# Altium footprint library 7.Connectors&Battary_holders.PcbLib: 133 footprints (part 4 of 9)
Each footprint in its own frame and in the unit in brackets; x right, y up, seen from the top. Pads: shape width x height; smd on the part's side, far side on the other; paste and mask are expansions set on the pad; w line width, h text height; cw(c..) or ccw(c..) is an arc to the next point about the centre after c.
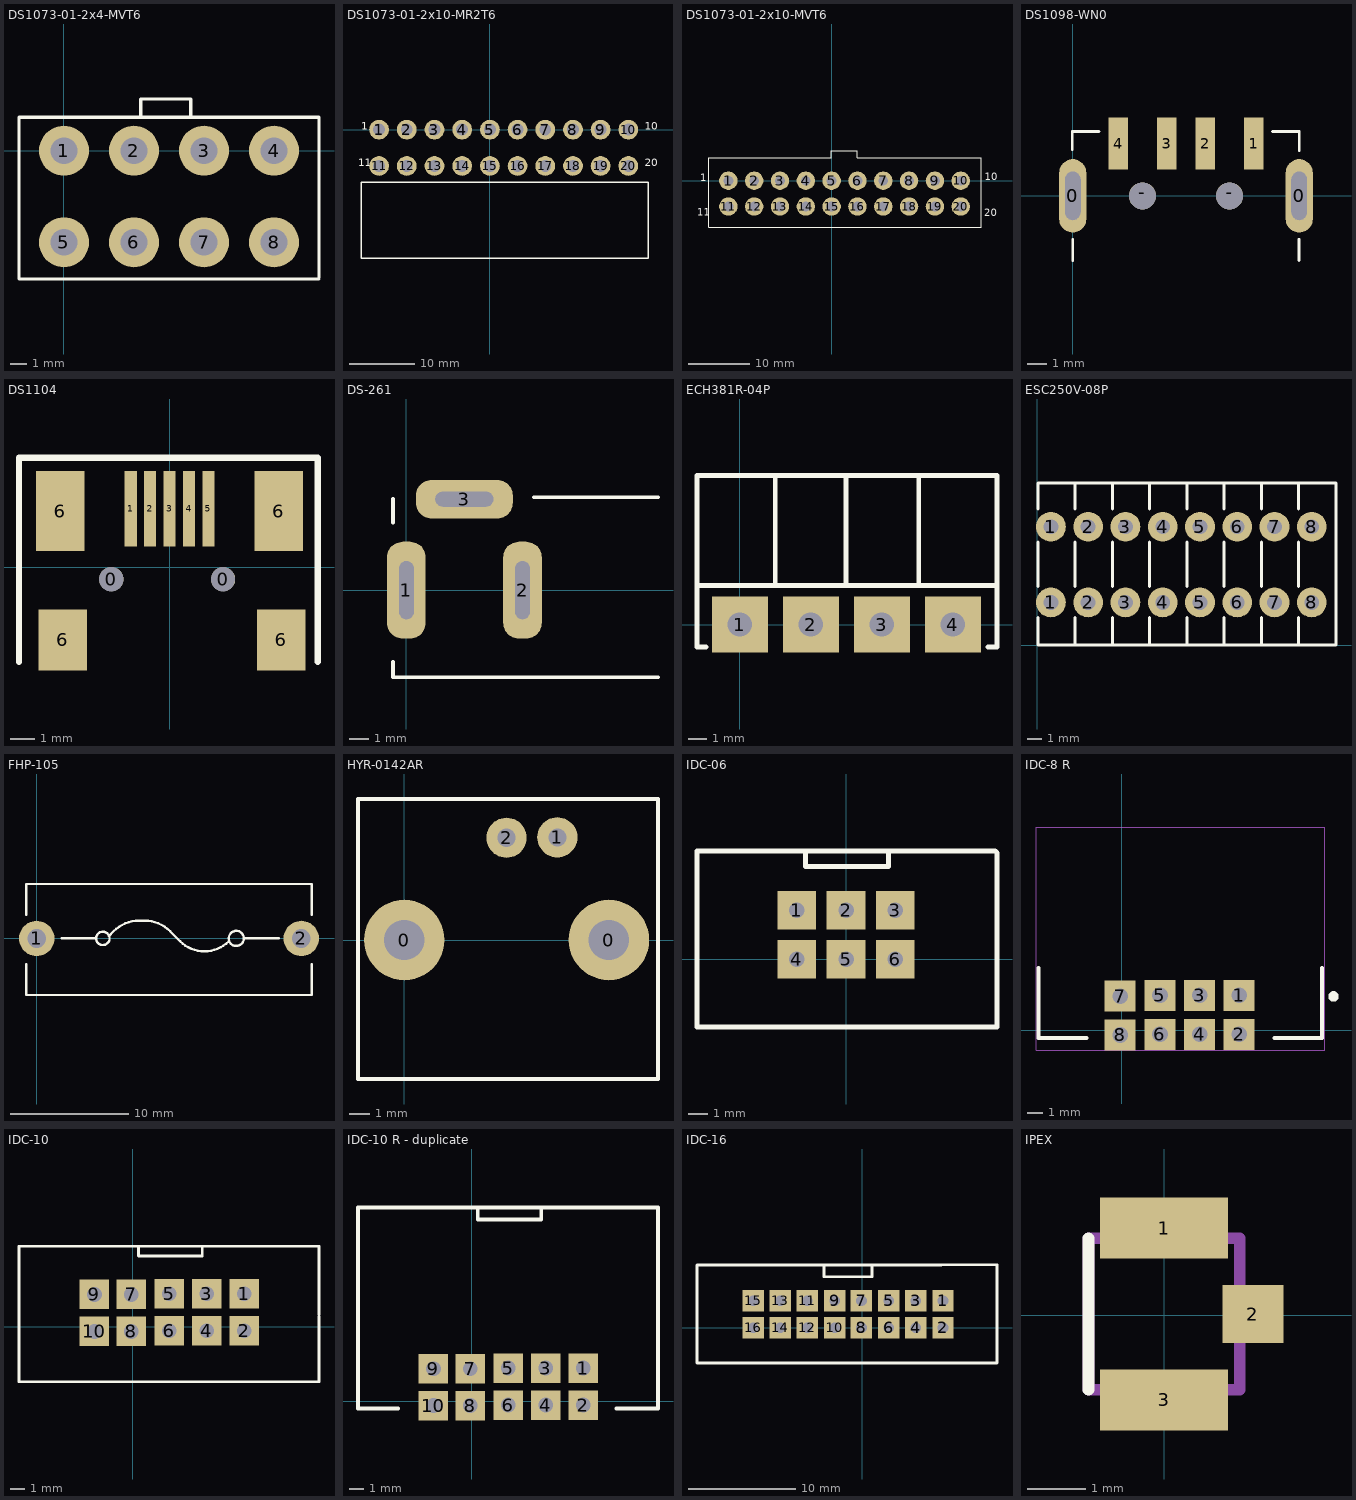
[diagram p3: the footprints below, top view; thin cyan lines are the x and y axes]

## DS1073-01-2x4-MVT6 [mm]
pads (8):
  round 3 hole 1.6: 1(0,0) 2(4.2,0) 3(8.4,0) 4(12.6,0) 5(0,-5.5) 6(4.2,-5.5) 7(8.4,-5.5) 8(12.6,-5.5)
Top Overlay:
  lines w0.2: 4.6,2 4.6,3.1 7.6,3.1 7.6,2.1 ; 15.3,-7.7 -2.7,-7.7 -2.7,2 15.3,2 15.3,-7.6
3D body "70374089.STEP": height 12.8, standoff -3.5, extent -3.1,-7.8 15.7,3.3

## DS1073-01-2x10-MR2T6 [mm]
pads (20):
  round 3 hole 1.8: 1(-16.8,0) 2(-12.6,0) 3(-8.4,0) 4(-4.2,0) 5(0,0) 6(4.2,0) 7(8.4,0) 8(12.6,0) 9(16.8,0) 10(21,0) 11(-16.8,-5.5) 12(-12.6,-5.5) 13(-8.4,-5.5) 14(-4.2,-5.5) 15(0,-5.5) 16(4.2,-5.5) 17(8.4,-5.5) 18(12.6,-5.5) 19(16.8,-5.5) 20(21,-5.5)
Top Overlay:
  lines w0.2: -19.5,-8 24,-8 24,-19.5 -19.45,-19.5 -19.475,-19.475 -19.475,-8
  text "20" at 23.5,-6 h2
  text "11" at -20,-6 h2
  text "10" at 23.5,-0.5 h2
  text "1" at -19.5,-0.5 h2
3D body "8116148_2-1586041-0.stp": height 12.3, standoff -2.5, extent -19.45,-19.575 24.25,0.56

## DS1073-01-2x10-MVT6 [mm]
pads (20):
  round 3 hole 1.6: 1(-16.8,0) 2(-12.6,0) 3(-8.4,0) 4(-4.2,0) 5(0,0) 6(4.2,0) 7(8.4,0) 8(12.6,0) 9(16.8,0) 10(21,0) 11(-16.8,-4.2) 12(-12.6,-4.2) 13(-8.4,-4.2) 14(-4.2,-4.2) 15(0,-4.2) 16(4.2,-4.2) 17(8.4,-4.2) 18(12.6,-4.2) 19(16.8,-4.2) 20(21,-4.2)
Top Overlay:
  lines w0.2: 4.1,4.9 -0.1,4.9 -0.1,3.7 -20,3.7 -20,-7.6 24.3,-7.6 24.3,3.7 ; 4.2,4.9 4.2,3.7 24.2,3.7
  text "20" at 24.8,-6.2 h2
  text "11" at -21.9,-6.1 h2
  text "10" at 24.9,-0.3 h2
  text "1" at -21.4,-0.5 h2
3D body "874272042.stp": height 13.5, standoff -3.3, extent -20.1,-7.6 24.3,3.8

## DS1098-WN0 [mm]
pads (8):
  rrect100% 1.4x3.8 hole 2.5 slot 0.8 at 0 deg: 0(0,0) 0(11.7,0)
  rect 1x2.7 smd: 1(9.35,2.7) 2(6.85,2.7) 3(4.85,2.7) 4(2.35,2.7)
  rrect100% 1.4x1.4 hole 1.4: -(3.6,0) -(8.1,0)
Top Overlay:
  lines w0.15: -0.025,2.4 -0.025,3.325 1.35,3.325 ; -0.002,-3.342 -0.002,-2.242 ; 10.314,3.333 11.7,3.333 11.7,2.35 ; 11.698,-3.342 11.698,-2.242
3D body "User Library-USB 2_0 Type A Male v2.step": height 4.7, standoff -2.3, extent -0.425,-17.976 12.002,3.626

## DS1104 [mm]
pads (11):
  round 1 hole 1: 0(-2.4,-0.5) 0(2.2,-0.5)
  rect 0.5x3.1 smd: 1(-1.6,2.4) 2(-0.8,2.4) 3(0,2.4) 4(0.8,2.4) 5(1.6,2.4)
  rect 2x3.3 smd: 6(-4.5,2.3) 6(4.5,2.3)
  rect 2x2.5 smd: 6(-4.4,-3) 6(4.6,-3)
Top Overlay:
  lines w0.254: -6.2,-3.9 -6.2,4.5 6.1,4.5 6.1,-3.9

## DS-261 [mm]
pads (3):
  rrect80% 2x5 hole 0.762 slot 3 at 90 deg: 1(0,0) 2(6,0)
  rrect80% 5x2 hole 0.762 slot 3 at 0 deg: 3(3,4.7)
Top Overlay:
  lines w0.2: -0.7,-3.7 -0.7,-4.5 13,-4.5 ; -0.7,3.5 -0.7,4.7 ; 6.6,4.8 13,4.8
3D body "User Library-DS-261A.step": height 11.1, standoff -3.4, extent -0.7,-4.5 13.7,4.8

## ECH381R-04P [mm]
pads (4):
  rect 3x3 hole 1.3: 1(0,0) 2(3.81,0) 3(7.62,0) 4(11.43,0)
Top Overlay:
  lines w0.256: -2.3,2.1 13.8,2.1 ; -1.8,-1.2 -2.3,-1.2 -2.3,8 13.8,8 13.8,-1.2 13.3,-1.2 ; 1.9,2.2 1.9,8 ; 5.7,2.1 5.7,8 ; 9.6,2.1 9.6,8

## ESC250V-08P [mm]
pads (16):
  round 2 hole 1: 1(0.9,2.875) 1(0.9,7.95) 2(3.4,2.875) 2(3.4,7.95) 3(5.9,2.875) 3(5.9,7.95) 4(8.4,2.875) 4(8.4,7.95) 5(10.9,2.875) 5(10.9,7.95) 6(13.4,2.875) 6(13.4,7.95) 7(15.9,2.875) 7(15.9,7.95) 8(18.4,2.875) 8(18.4,7.95)
Top Overlay:
  lines w0.2: 0.025,1.85 0.025,0.025 2.575,0.025 ; 0.025,3.925 0.025,6.925 ; 0.025,9.125 0.025,10.85 ; 0.025,10.875 2.575,10.875 ; 2.525,1.85 2.525,0.025 5.075,0.025 ; 2.525,3.925 2.525,6.925 ; 2.525,9.125 2.525,10.85 ; 2.525,10.875 5.075,10.875 ; 5.025,1.85 5.025,0.025 7.575,0.025 ; 5.025,3.925 5.025,6.925 ; 5.025,9.125 5.025,10.85 ; 5.025,10.875 7.575,10.875 ; 7.525,1.85 7.525,0.025 10.075,0.025 ; 7.525,3.925 7.525,6.925 ; 7.525,9.125 7.525,10.85 ; 7.525,10.875 10.075,10.875 ; 10.025,1.85 10.025,0.025 12.575,0.025 ; 10.025,3.925 10.025,6.925 ; 10.025,9.125 10.025,10.825 ; 10.025,10.875 12.575,10.875 ; 12.525,1.85 12.525,0.025 15.075,0.025 ; 12.525,3.925 12.525,6.925 ; 12.525,9.125 12.525,10.85 ; 12.525,10.875 15.075,10.875 ; 15.025,1.85 15.025,0.025 17.575,0.025 ; 15.025,3.925 15.025,6.925 ; 15.025,9.125 15.025,10.825 ; 15.025,10.875 17.575,10.875 ; 17.525,1.85 17.525,0.025 20.025,0.025 20.025,10.8 ; 17.525,3.925 17.525,6.925 ; 17.525,9.125 17.525,10.85 ; 17.525,10.875 20.025,10.875
3D body "User Library-DG141V.step": height 14.6, standoff -2.5, extent 0.035,0.025 2.575,12.625
3D body "User Library-DG141V.step": height 14.6, standoff -2.5, extent 2.535,0.025 5.075,12.625
3D body "User Library-DG141V.step": height 14.6, standoff -2.5, extent 5.035,0.025 7.575,12.625
3D body "User Library-DG141V.step": height 14.6, standoff -2.5, extent 7.535,0.025 10.075,12.625
3D body "User Library-DG141V.step": height 14.6, standoff -2.5, extent 10.035,0.025 12.575,12.625
3D body "User Library-DG141V.step": height 14.6, standoff -2.5, extent 12.535,0.025 15.075,12.625
3D body "User Library-DG141V.step": height 14.6, standoff -2.5, extent 15.035,0.025 17.575,12.625
3D body "User Library-DG141V.step": height 14.6, standoff -2.5, extent 17.535,0.025 20.075,12.625

## FHP-105 [mm]
pads (2):
  round 3 hole 1.6: 1(0,0) 2(22.4,0)
Top Overlay:
  circle w0.2: c16.9,0 r0.64
  circle w0.2: c5.6,0 r0.566
  lines w0.2: -0.9,-2.2 -0.9,-4.8 23.3,-4.8 23.3,-2.2 ; -0.9,2 -0.9,4.6 23.3,4.6 23.3,2 ; 2.1,0 5,0 ; 6.112,0.212 6.502,0.602 cw(c8.67,-1.566) 8.67,1.5 9.13,1.5 cw(c9.13,-1.566) 11.298,0.602 12.151,-0.251 ccw(c14.2,1.797) 14.2,-1.1 ccw(c14.2,1.797) 16.249,-0.251 ; 17.6,0 20.5,0
3D body "User Library-FHP-105.step": height 10.9, standoff -2.9, extent -0.9,-4.9 23.3,4.9

## HYR-0142AR [mm]
pads (4):
  round 4 hole 2: 0(0,0) 0(10.16,0)
  round 2 hole 0.9: 1(7.6,5.1) 2(5.08,5.08)
Top Overlay:
  lines w0.2: -2.3,-6.9 12.6,-6.9 12.6,-2.2 12.6,7 -2.3,7 -2.3,-2.2 -2.3,-6.9
3D body "73100-0131.STEP": height 13.15, standoff -5.08, extent -2.26,-27.78 12.5,7.4

## IDC-06 [mm]
pads (6):
  rect 2x2 hole 0.8: 1(-2.54,2.54) 2(0,2.54) 3(2.54,2.54) 4(-2.54,0) 5(0,0) 6(2.54,0)
Top Overlay:
  lines w0.256: -7.7,5.6 -7.7,-3.5 7.8,-3.5 ; -7.6,5.6 7.7,5.6 7.8,5.5 7.8,-3.4 ; -2.1,5.5 -2.1,4.8 2.2,4.8 2.2,5.5

## IDC-8 R [mm]
pads (8):
  rect 2x2 hole 1: 1(7.54,2.24) 2(7.54,-0.26) 3(5,2.24) 4(5,-0.26) 5(2.46,2.24) 6(2.46,-0.26) 7(-0.1,2.2) 8(-0.1,-0.3)
Top Overlay:
  circle w0.35: c13.6,2.175 r0.16
  lines w0.254: 12.85,-0.5 12.85,4
  lines w0.256: -5.325,4 -5.325,-0.5 -2.25,-0.5 ; 9.8,-0.5 12.85,-0.5
Mechanical 15:
  lines w0.05: -5.5,-1.275 -5.5,13.025 13.025,13.025 13.025,-1.275 -5.5,-1.275
3D body "IDC Socket Male 8pin Angled THT Goldplated 2_54mm.STEP": height 8.98, standoff -2.37, extent -5.46,-0.605 12.94,12.955

## IDC-10 [mm]
pads (10):
  rect 2x2 hole 1: 1(7.54,2.24) 2(7.54,-0.26) 3(5,2.24) 4(5,-0.26) 5(2.46,2.24) 6(2.46,-0.26) 7(-0.1,2.2) 8(-0.1,-0.3) 9(-2.6,2.2) 10(-2.6,-0.3)
Top Overlay:
  lines w0.2: 0.4,5.436 0.4,4.8 4.7,4.8 4.7,5.436 ; 12.6,0.7 12.6,-3.708 -7.7,-3.708 -7.7,5.461 7.561,5.461 12.6,5.461 12.6,0.8
3D body "User Library-IDC-10M.STEP": height 2.7, standoff -9.7, extent -7.696,-3.763 12.604,5.337

## IDC-10 R - duplicate [mm]
pads (10):
  rect 2x2 hole 1: 1(7.54,2.24) 2(7.54,-0.26) 3(5,2.24) 4(5,-0.26) 5(2.46,2.24) 6(2.46,-0.26) 7(-0.1,2.2) 8(-0.1,-0.3) 9(-2.6,2.2) 10(-2.6,-0.3)
Top Overlay:
  lines w0.254: 7.7,13.1 12.6,13.1 12.6,8.3
  lines w0.256: -7.7,13.1 -7.7,-0.5 -5,-0.5 ; -7.6,13.1 7.7,13.1 ; 0.4,13 0.4,12.3 4.7,12.3 4.7,13 ; 9.8,-0.5 12.5,-0.5 ; 12.6,-0.5 12.6,8.2
3D body "User Library-BH10R-1.STEP": height 9.35, standoff -2.4, extent -7.7,-0.63 12.7,13.25

## IDC-16 [mm]
pads (16):
  rect 2x2 hole 1: 1(7.54,2.54) 2(7.54,0) 3(5,2.54) 4(5,0) 5(2.46,2.54) 6(2.46,0) 7(-0.1,2.54) 8(-0.1,0) 9(-2.6,2.54) 10(-2.6,0) 11(-5.16,2.54) 12(-5.16,0) 13(-7.7,2.54) 14(-7.7,0) 15(-10.24,2.54) 16(-10.24,0)
Top Overlay:
  lines w0.254: 7.4,5.9 12.6,5.9 12.6,0.8
  lines w0.256: -3.6,5.8 -3.6,4.8 0.9,4.8 0.9,5.8 ; 7.4,5.9 -15.5,5.9 -15.5,-3.3 12.6,-3.3 12.6,0.7
3D body "User Library-User Library-IDC-16M.STEP": height 9.3, standoff -3.1, extent -15.5,-3.45 12.5,5.65

## IPEX [mm]
pads (3):
  rect 2.2x1.05 smd: 1(0,1.5) 3(0,-1.45)
  rect 1.05x1 smd: 2(1.525,0.025)
Top Overlay:
  lines w0.2: -1.3,-1.275 -1.3,1.325
Mechanical 13:
  lines w0.2: -1.3,-1.275 1.3,-1.275 1.3,1.325 -1.3,1.325 -1.3,-1.275
3D body "User Library-IPEX.step": height 1.25, standoff -0.01, extent -1.525,-1.45 1.575,1.55